# Altium footprint library STM32L476VE.PcbLib: 29 footprints (part 1 of 2)
Each footprint in its own frame and in the unit in brackets; x right, y up, seen from the top. Pads: shape width x height; smd on the part's side, far side on the other; paste and mask are expansions set on the pad; w line width, h text height; cw(c..) or ccw(c..) is an arc to the next point about the centre after c.
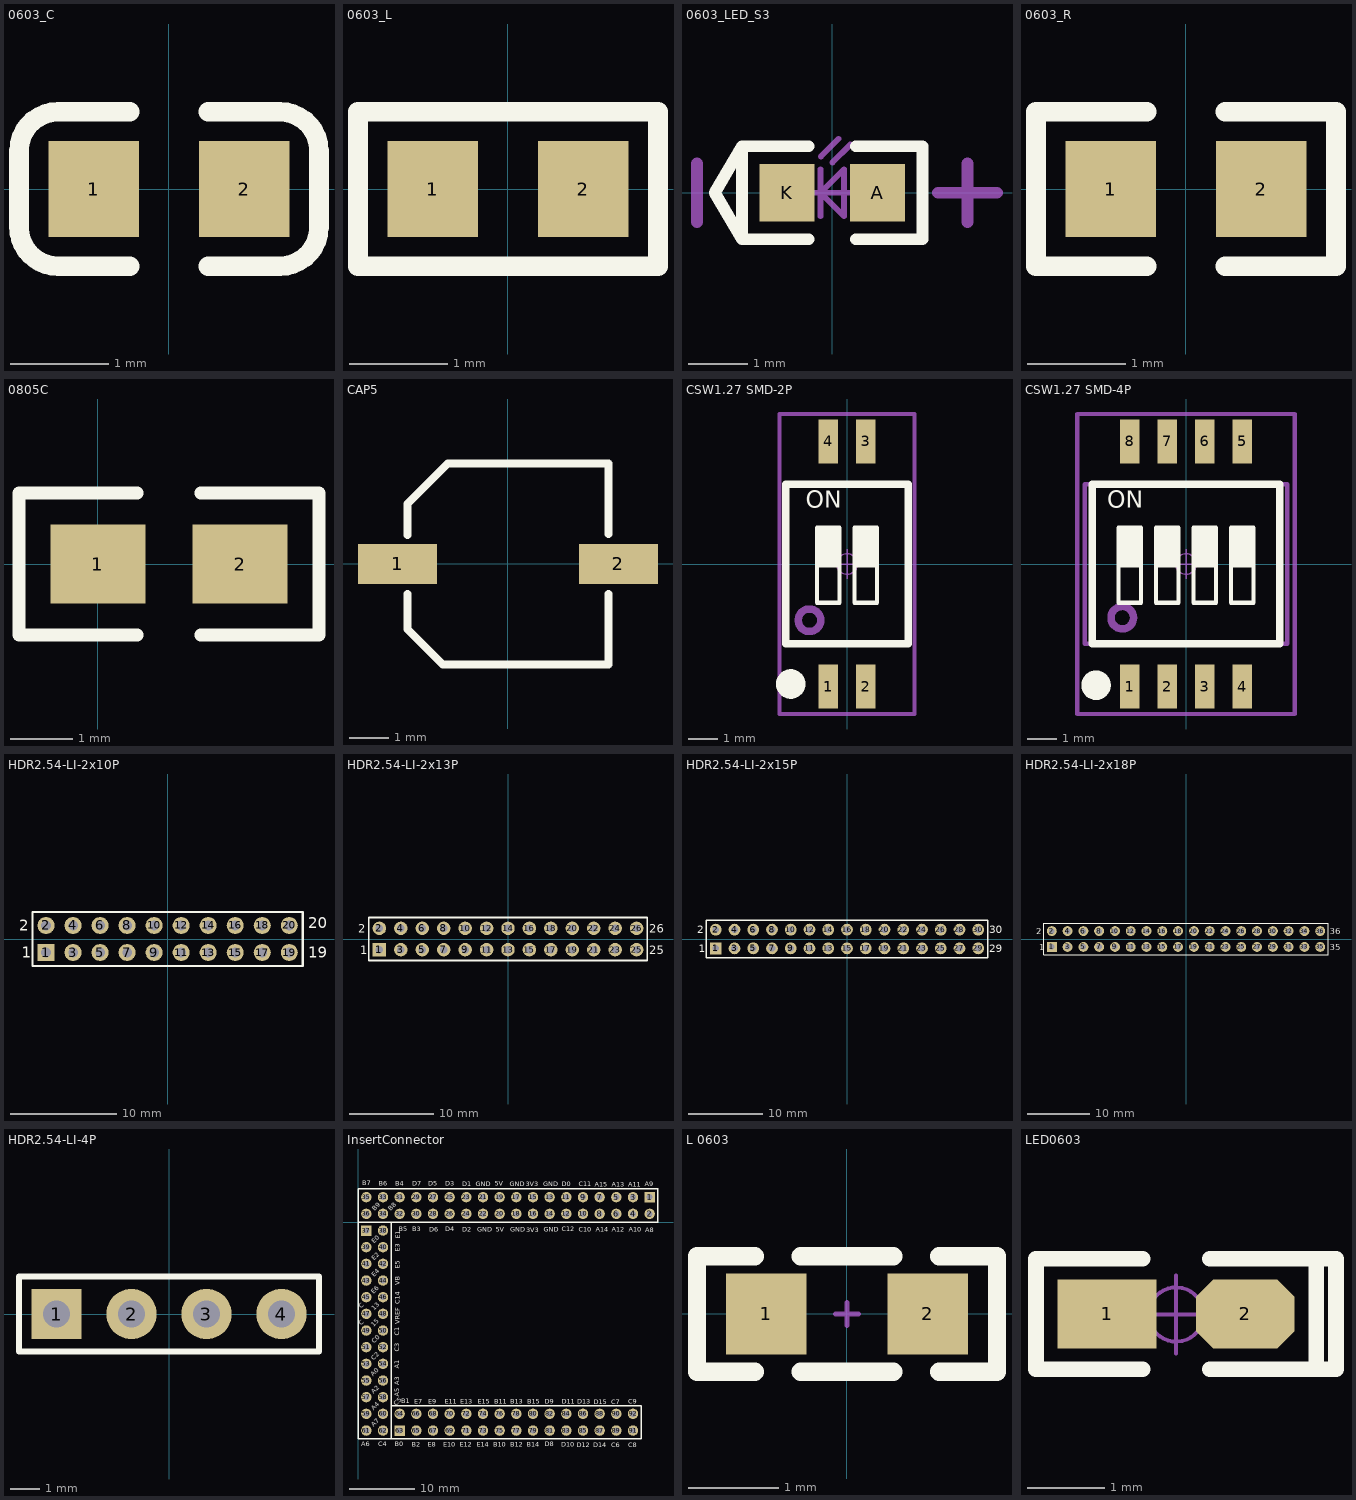
[diagram p0: the footprints below, top view; thin cyan lines are the x and y axes]

## 0603_C [mm]
pads (2):
  rect 0.93x0.98 smd: 1(-0.77,0) 2(0.77,0)
Top Overlay:
  lines w0.2: -0.4,-0.79 -1.135,-0.79 cw(c-1.135,-0.39) -1.535,-0.39 -1.535,0.39 cw(c-1.135,0.39) -1.135,0.79 -0.4,0.79 ; 0.4,-0.79 1.135,-0.79 ccw(c1.135,-0.39) 1.535,-0.39 1.535,0.39 ccw(c1.135,0.39) 1.135,0.79 0.4,0.79
3D body "User Library-0603 SMD Capacitor.STEP": height 0.3, standoff 0, extent -0.8,-0.4 0.8,0.4

## 0603_L [mm]
pads (2):
  rect 0.93x0.98 smd: 1(-0.77,0) 2(0.77,0)
Top Overlay:
  lines w0.2: -1.535,-0.79 1.535,-0.79 1.535,0.79 -1.535,0.79 -1.535,-0.79
3D body "L0603.STEP": height 0.46, standoff -0.01, extent -0.825,-0.412 0.825,0.413

## 0603_LED_S3 [mm]
pads (2):
  rect 0.93x0.98 smd: A(0.77,0) K(-0.77,0)
Top Overlay:
  lines w0.2: -0.4,-0.79 -1.535,-0.79 ; -0.4,0.79 -1.535,0.79 ; 0.4,-0.79 1.535,-0.79 1.535,0.79 0.4,0.79 ; -1.535,-0.79 -1.535,0.79 ; -1.535,-0.79 -2,0 -1.535,0.79
Mechanical 13:
  lines w0.1: -0.4,0 0.4,0 ; -0.2,-0.4 -0.2,0.4 ; -0.195,0.617 0.105,0.917 ; 0.005,0.517 0.305,0.817 ; -0.2,0 0.2,-0.4 0.2,0.4 -0.2,0
Mechanical 15:
  lines w0.203: -2.3,-0.5 -2.3,0.5 ; 1.8,0 2.8,0 ; 2.3,-0.5 2.3,0.5
3D body "User Library-LED_0603_R.STEP": height 0.6, standoff 0, extent -0.8,-0.4 0.8,0.4

## 0603_R [mm]
pads (2):
  rect 0.93x0.98 smd: 1(-0.77,0) 2(0.77,0)
Top Overlay:
  lines w0.2: -0.4,-0.79 -1.535,-0.79 -1.535,0.79 -0.4,0.79 ; 0.4,-0.79 1.535,-0.79 1.535,0.79 0.4,0.79
3D body "User Library-RES_1609-0603.STEP": height 0.56, standoff 0, extent -0.85,-0.4 0.85,0.4

## 0805C [mil] "2.0mmx1.2mm（蒜米工坊）"
height 19.68
pads (2):
  rect 60x50 smd: 1(0,0) 2(90,0)
Top Overlay:
  lines w8: 25,-45 -50,-45 -50,45 25,45 ; 65,-45 140,-45 140,45 65,45
3D body "R0805.STEP": height 21.65, standoff 0, extent 4.64,-24.8 83.37,24.81

## CAP5 [mm] "直径5mm"
pads (2):
  rect 2x1 smd: 1(-2.794,0) 2(2.794,0)
Top Overlay:
  lines w0.2: -2.54,-0.762 -2.54,-1.651 -1.651,-2.54 2.54,-2.54 2.54,-0.762 ; -2.54,0.73 -2.54,1.524 -1.524,2.54 2.54,2.54 2.54,0.762
3D body "SL-B.STEP": height 5.2, standoff 0, extent -2.274,-2.15 2.326,2.15

## CSW1.27 SMD-2P [mm] "长：4.14mm，宽：5.4mm，高：2.3mm"
pads (4):
  rect 0.65x1.5 smd: 1(-0.635,-4.15) 2(0.635,-4.15) 3(0.635,4.15) 4(-0.635,4.15)
Top Overlay:
  circle w0.5: c-1.905,-4.064 r0.25
  region: -0.254,1.225 -1.016,1.225 -1.016,-0.045 -0.254,-0.045
  region: 1.016,1.225 0.254,1.225 0.254,-0.045 1.016,-0.045
  lines w0.15: -1.016,-0.045 -0.254,-0.045 ; 0.254,-0.045 1.016,-0.045 ; -1.016,-1.315 -0.254,-1.315 -0.254,1.225 -1.016,1.225 -1.016,-1.315 ; 0.254,-1.315 1.016,-1.315 1.016,1.225 0.254,1.225 0.254,-1.315
  lines w0.254: -2.07,-2.7 -2.07,2.7 2.07,2.7 2.07,-2.7 -2.07,-2.7
  text "ON" at -1.397,1.696 h1
Mechanical 13:
  circle w0.254: c-1.27,-1.905 r0.381
  lines w0.15: -2.032,-2.7 2.032,-2.7 2.032,2.7 -2.032,2.7 -2.032,-2.7
Mechanical 15:
  circle w0.05: c0,0 r0.35
  lines w0.05: -0.5,0 0.5,0 ; 0,-0.5 0,0.5
  lines w0.15: -2.286,-5.08 2.159,-5.08 2.286,-5.08 2.286,5.08 -2.286,5.08 -2.286,-5.08
3D body "CSW1.27-SMD-2P.STEP": height 2.35, standoff 0, extent -2.07,-4.35 2.07,4.35

## CSW1.27 SMD-4P [mm] "长：6.68mm，宽：5.4mm，高：2.3mm"
pads (8):
  rect 0.65x1.5 smd: 1(-1.905,-4.15) 2(-0.635,-4.15) 3(0.635,-4.15) 4(1.905,-4.15) 5(1.905,4.15) 6(0.635,4.15) 7(-0.635,4.15) 8(-1.905,4.15)
Top Overlay:
  circle w0.5: c-3.048,-4.105 r0.25
  region: 2.286,1.225 1.524,1.225 1.524,-0.045 2.286,-0.045
  region: 1.016,1.225 0.254,1.225 0.254,-0.045 1.016,-0.045
  region: -0.254,1.225 -1.016,1.225 -1.016,-0.045 -0.254,-0.045
  region: -1.524,1.225 -2.286,1.225 -2.286,-0.045 -1.524,-0.045
  lines w0.15: -2.286,-0.045 -1.524,-0.045 ; -1.016,-0.045 -0.254,-0.045 ; 0.254,-0.045 1.016,-0.045 ; 1.524,-0.045 2.286,-0.045 ; -2.286,-1.315 -2.286,1.225 -1.524,1.225 -1.524,-1.315 -2.286,-1.315 ; -1.016,-1.315 -1.016,1.225 -0.254,1.225 -0.254,-1.315 -1.016,-1.315 ; 0.254,-1.315 0.254,1.225 1.016,1.225 1.016,-1.315 0.254,-1.315 ; 1.524,-1.315 1.524,1.225 2.286,1.225 2.286,-1.315 1.524,-1.315
  lines w0.254: -3.175,-2.7 3.175,-2.7 3.175,2.7 -3.175,2.7 -3.175,-2.7
  text "ON" at -2.667,1.696 h1
Mechanical 13:
  circle w0.254: c-2.159,-1.819 r0.381
  lines w0.15: -3.429,-2.7 -3.429,2.7 3.429,2.7 3.429,-2.7 -3.429,-2.7
Mechanical 15:
  circle w0.05: c0,0 r0.35
  lines w0.05: -0.5,0 0.5,0 ; 0,-0.5 0,0.5
  lines w0.15: -3.683,-5.08 -3.683,5.08 3.683,5.08 3.683,-5.08 2.159,-5.08 -3.683,-5.08
3D body "CSW1.27-SMD-4P.STEP": height 2.35, standoff 0, extent -3.34,-4.35 3.34,4.35

## HDR2.54-LI-2x10P [mm] "双排排针，10x2脚"
pads (20):
  rect 1.6x1.6 hole 0.9: 1(-11.43,-1.27)
  round 1.6 hole 0.9: 2(-11.43,1.27) 3(-8.89,-1.27) 4(-8.89,1.27) 5(-6.35,-1.27) 6(-6.35,1.27) 7(-3.81,-1.27) 8(-3.81,1.27) 9(-1.27,-1.27) 10(-1.27,1.27) 11(1.27,-1.27) 12(1.27,1.27) 13(3.81,-1.27) 14(3.81,1.27) 15(6.35,-1.27) 16(6.35,1.27) 17(8.89,-1.27) 18(8.89,1.27) 19(11.43,-1.27) 20(11.43,1.27)
Top Overlay:
  lines w0.2: -12.7,-2.54 -12.7,2.54 12.7,2.54 12.7,-2.54 -12.7,-2.54
  text "2" at -13.97,0.762 h1.02
  text "1" at -13.716,-1.778 h1.02
  text "20" at 13.208,1.016 h1.02
  text "19" at 13.208,-1.778 h1.02
3D body "HDR2.54-1x2P.STEP": height 8.5, standoff -3, extent -2.54,-2.54 0,2.54
3D body "HDR2.54-1x2P.STEP": height 8.5, standoff -3, extent -10.16,-2.54 -7.62,2.54
3D body "HDR2.54-1x2P.STEP": height 8.5, standoff -3, extent -12.7,-2.54 -10.16,2.54
3D body "HDR2.54-1x2P.STEP": height 8.5, standoff -3, extent -5.08,-2.54 -2.54,2.54
3D body "HDR2.54-1x2P.STEP": height 8.5, standoff -3, extent -7.62,-2.54 -5.08,2.54
3D body "HDR2.54-1x2P.STEP": height 8.5, standoff -3, extent 10.16,-2.54 12.7,2.54
3D body "HDR2.54-1x2P.STEP": height 8.5, standoff -3, extent 2.54,-2.54 5.08,2.54
3D body "HDR2.54-1x2P.STEP": height 8.5, standoff -3, extent 0,-2.54 2.54,2.54
3D body "HDR2.54-1x2P.STEP": height 8.5, standoff -3, extent 7.62,-2.54 10.16,2.54
3D body "HDR2.54-1x2P.STEP": height 8.5, standoff -3, extent 5.08,-2.54 7.62,2.54

## HDR2.54-LI-2x13P [mm] "双排排针，13x2脚"
pads (26):
  rect 1.6x1.6 hole 0.9: 1(-15.24,-1.27)
  round 1.6 hole 0.9: 2(-15.24,1.27) 3(-12.7,-1.27) 4(-12.7,1.27) 5(-10.16,-1.27) 6(-10.16,1.27) 7(-7.62,-1.27) 8(-7.62,1.27) 9(-5.08,-1.27) 10(-5.08,1.27) 11(-2.54,-1.27) 12(-2.54,1.27) 13(0,-1.27) 14(0,1.27) 15(2.54,-1.27) 16(2.54,1.27) 17(5.08,-1.27) 18(5.08,1.27) 19(7.62,-1.27) 20(7.62,1.27) 21(10.16,-1.27) 22(10.16,1.27) 23(12.7,-1.27) 24(12.7,1.27) 25(15.24,-1.27) 26(15.24,1.27)
Top Overlay:
  lines w0.2: -16.51,-2.54 -16.51,2.54 16.51,2.54 16.51,-2.54 -16.51,-2.54
  text "2" at -17.78,0.762 h1.02
  text "1" at -17.526,-1.778 h1.02
  text "25" at 16.764,-1.778 h1.02
  text "26" at 16.764,0.762 h1.02
3D body "HDR2.54-1x2P.STEP": height 8.5, standoff -3, extent -6.35,-2.54 -3.81,2.54
3D body "HDR2.54-1x2P.STEP": height 8.5, standoff -3, extent -13.97,-2.54 -11.43,2.54
3D body "HDR2.54-1x2P.STEP": height 8.5, standoff -3, extent -16.51,-2.54 -13.97,2.54
3D body "HDR2.54-1x2P.STEP": height 8.5, standoff -3, extent -8.89,-2.54 -6.35,2.54
3D body "HDR2.54-1x2P.STEP": height 8.5, standoff -3, extent -11.43,-2.54 -8.89,2.54
3D body "HDR2.54-1x2P.STEP": height 8.5, standoff -3, extent 6.35,-2.54 8.89,2.54
3D body "HDR2.54-1x2P.STEP": height 8.5, standoff -3, extent -1.27,-2.54 1.27,2.54
3D body "HDR2.54-1x2P.STEP": height 8.5, standoff -3, extent -3.81,-2.54 -1.27,2.54
3D body "HDR2.54-1x2P.STEP": height 8.5, standoff -3, extent 3.81,-2.54 6.35,2.54
3D body "HDR2.54-1x2P.STEP": height 8.5, standoff -3, extent 1.27,-2.54 3.81,2.54
3D body "HDR2.54-1x2P.STEP": height 8.5, standoff -3, extent 11.43,-2.54 13.97,2.54
3D body "HDR2.54-1x2P.STEP": height 8.5, standoff -3, extent 8.89,-2.54 11.43,2.54
3D body "HDR2.54-1x2P.STEP": height 8.5, standoff -3, extent 13.97,-2.54 16.51,2.54

## HDR2.54-LI-2x15P [mm] "双排排针，15x2脚"
pads (30):
  rect 1.6x1.6 hole 0.9: 1(-17.78,-1.27)
  round 1.6 hole 0.9: 2(-17.78,1.27) 3(-15.24,-1.27) 4(-15.24,1.27) 5(-12.7,-1.27) 6(-12.7,1.27) 7(-10.16,-1.27) 8(-10.16,1.27) 9(-7.62,-1.27) 10(-7.62,1.27) 11(-5.08,-1.27) 12(-5.08,1.27) 13(-2.54,-1.27) 14(-2.54,1.27) 15(0,-1.27) 16(0,1.27) 17(2.54,-1.27) 18(2.54,1.27) 19(5.08,-1.27) 20(5.08,1.27) 21(7.62,-1.27) 22(7.62,1.27) 23(10.16,-1.27) 24(10.16,1.27) 25(12.7,-1.27) 26(12.7,1.27) 27(15.24,-1.27) 28(15.24,1.27) 29(17.78,-1.27) 30(17.78,1.27)
Top Overlay:
  lines w0.2: -19.05,-2.54 -19.05,2.54 19.05,2.54 19.05,-2.54 -19.05,-2.54
  text "30" at 19.304,0.762 h1.02
  text "29" at 19.304,-1.778 h1.02
  text "2" at -20.32,0.762 h1.02
  text "1" at -20.066,-1.778 h1.02
3D body "HDR2.54-1x2P.STEP": height 8.5, standoff -3, extent 11.43,-2.54 13.97,2.54
3D body "HDR2.54-1x2P.STEP": height 8.5, standoff -3, extent 13.97,-2.54 16.51,2.54
3D body "HDR2.54-1x2P.STEP": height 8.5, standoff -3, extent 6.35,-2.54 8.89,2.54
3D body "HDR2.54-1x2P.STEP": height 8.5, standoff -3, extent 8.89,-2.54 11.43,2.54
3D body "HDR2.54-1x2P.STEP": height 8.5, standoff -3, extent 16.51,-2.54 19.05,2.54
3D body "HDR2.54-1x2P.STEP": height 8.5, standoff -3, extent -1.27,-2.54 1.27,2.54
3D body "HDR2.54-1x2P.STEP": height 8.5, standoff -3, extent 1.27,-2.54 3.81,2.54
3D body "HDR2.54-1x2P.STEP": height 8.5, standoff -3, extent -6.35,-2.54 -3.81,2.54
3D body "HDR2.54-1x2P.STEP": height 8.5, standoff -3, extent -3.81,-2.54 -1.27,2.54
3D body "HDR2.54-1x2P.STEP": height 8.5, standoff -3, extent 3.81,-2.54 6.35,2.54
3D body "HDR2.54-1x2P.STEP": height 8.5, standoff -3, extent -13.97,-2.54 -11.43,2.54
3D body "HDR2.54-1x2P.STEP": height 8.5, standoff -3, extent -11.43,-2.54 -8.89,2.54
3D body "HDR2.54-1x2P.STEP": height 8.5, standoff -3, extent -19.05,-2.54 -16.51,2.54
3D body "HDR2.54-1x2P.STEP": height 8.5, standoff -3, extent -16.51,-2.54 -13.97,2.54
3D body "HDR2.54-1x2P.STEP": height 8.5, standoff -3, extent -8.89,-2.54 -6.35,2.54

## HDR2.54-LI-2x18P [mm] "双排排针，18x2脚"
pads (36):
  rect 1.6x1.6 hole 0.9: 1(-21.59,-1.27)
  round 1.6 hole 0.9: 2(-21.59,1.27) 3(-19.05,-1.27) 4(-19.05,1.27) 5(-16.51,-1.27) 6(-16.51,1.27) 7(-13.97,-1.27) 8(-13.97,1.27) 9(-11.43,-1.27) 10(-11.43,1.27) 11(-8.89,-1.27) 12(-8.89,1.27) 13(-6.35,-1.27) 14(-6.35,1.27) 15(-3.81,-1.27) 16(-3.81,1.27) 17(-1.27,-1.27) 18(-1.27,1.27) 19(1.27,-1.27) 20(1.27,1.27) 21(3.81,-1.27) 22(3.81,1.27) 23(6.35,-1.27) 24(6.35,1.27) 25(8.89,-1.27) 26(8.89,1.27) 27(11.43,-1.27) 28(11.43,1.27) 29(13.97,-1.27) 30(13.97,1.27) 31(16.51,-1.27) 32(16.51,1.27) 33(19.05,-1.27) 34(19.05,1.27) 35(21.59,-1.27) 36(21.59,1.27)
Top Overlay:
  lines w0.2: -17.78,-2.54 -22.86,-2.54 ; -22.86,-2.54 22.86,-2.54 22.86,2.54 -22.86,2.54 -22.86,-2.54
  text "36" at 23.114,0.762 h1.02
  text "35" at 23.114,-1.778 h1.02
  text "1" at -23.622,-1.778 h1.02
  text "2" at -24.13,0.762 h1.02
3D body "HDR2.54-1x2P.STEP": height 8.5, standoff -3, extent -12.7,-2.54 -10.16,2.54
3D body "HDR2.54-1x2P.STEP": height 8.5, standoff -3, extent -20.32,-2.54 -17.78,2.54
3D body "HDR2.54-1x2P.STEP": height 8.5, standoff -3, extent -22.86,-2.54 -20.32,2.54
3D body "HDR2.54-1x2P.STEP": height 8.5, standoff -3, extent -15.24,-2.54 -12.7,2.54
3D body "HDR2.54-1x2P.STEP": height 8.5, standoff -3, extent -17.78,-2.54 -15.24,2.54
3D body "HDR2.54-1x2P.STEP": height 8.5, standoff -3, extent 0,-2.54 2.54,2.54
3D body "HDR2.54-1x2P.STEP": height 8.5, standoff -3, extent -7.62,-2.54 -5.08,2.54
3D body "HDR2.54-1x2P.STEP": height 8.5, standoff -3, extent -10.16,-2.54 -7.62,2.54
3D body "HDR2.54-1x2P.STEP": height 8.5, standoff -3, extent -2.54,-2.54 0,2.54
3D body "HDR2.54-1x2P.STEP": height 8.5, standoff -3, extent -5.08,-2.54 -2.54,2.54
3D body "HDR2.54-1x2P.STEP": height 8.5, standoff -3, extent 12.7,-2.54 15.24,2.54
3D body "HDR2.54-1x2P.STEP": height 8.5, standoff -3, extent 5.08,-2.54 7.62,2.54
3D body "HDR2.54-1x2P.STEP": height 8.5, standoff -3, extent 2.54,-2.54 5.08,2.54
3D body "HDR2.54-1x2P.STEP": height 8.5, standoff -3, extent 10.16,-2.54 12.7,2.54
3D body "HDR2.54-1x2P.STEP": height 8.5, standoff -3, extent 7.62,-2.54 10.16,2.54
3D body "HDR2.54-1x2P.STEP": height 8.5, standoff -3, extent 17.78,-2.54 20.32,2.54
3D body "HDR2.54-1x2P.STEP": height 8.5, standoff -3, extent 15.24,-2.54 17.78,2.54
3D body "HDR2.54-1x2P.STEP": height 8.5, standoff -3, extent 20.32,-2.54 22.86,2.54

## HDR2.54-LI-4P [mm] "排针，4脚"
pads (4):
  rect 1.7x1.7 hole 0.9: 1(-3.81,0)
  round 1.7 hole 0.9: 2(-1.27,0) 3(1.27,0) 4(3.81,0)
Top Overlay:
  lines w0.2: -5.08,-1.27 -5.08,1.27 5.08,1.27 5.08,-1.27 -5.08,-1.27
3D body "HDR2.54-1P.STEP": height 8.5, standoff -3, extent -5.08,-1.27 -2.54,1.27
3D body "HDR2.54-1P.STEP": height 8.5, standoff -3, extent -2.54,-1.27 0,1.27
3D body "HDR2.54-1P.STEP": height 8.5, standoff -3, extent 0,-1.27 2.54,1.27
3D body "HDR2.54-1P.STEP": height 8.5, standoff -3, extent 2.54,-1.27 5.08,1.27

## InsertConnector [mm] "核心板安装到其他板子上用的接口"
pads (92):
  rect 1.6x1.6 hole 0.9: 1(44.45,3.81) 37(1.27,-1.27) 63(6.35,-31.75)
  round 1.6 hole 0.9: 2(44.45,1.27) 3(41.91,3.81) 4(41.91,1.27) 5(39.37,3.81) 6(39.37,1.27) 7(36.83,3.81) 8(36.83,1.27) 9(34.29,3.81) 10(34.29,1.27) 11(31.75,3.81) 12(31.75,1.27) 13(29.21,3.81) 14(29.21,1.27) 15(26.67,3.81) 16(26.67,1.27) 17(24.13,3.81) 18(24.13,1.27) 19(21.59,3.81) 20(21.59,1.27) 21(19.05,3.81) 22(19.05,1.27) 23(16.51,3.81) 24(16.51,1.27) 25(13.97,3.81) 26(13.97,1.27) 27(11.43,3.81) 28(11.43,1.27) 29(8.89,3.81) 30(8.89,1.27) 31(6.35,3.81) 32(6.35,1.27) 33(3.81,3.81) 34(3.81,1.27) 35(1.27,3.81) 36(1.27,1.27) 38(3.81,-1.27) 39(1.27,-3.81) 40(3.81,-3.81) 41(1.27,-6.35) 42(3.81,-6.35) 43(1.27,-8.89) 44(3.81,-8.89) 45(1.27,-11.43) 46(3.81,-11.43) 47(1.27,-13.97) 48(3.81,-13.97) 49(1.27,-16.51) 50(3.81,-16.51) 51(1.27,-19.05) 52(3.81,-19.05) 53(1.27,-21.59) 54(3.81,-21.59) 55(1.27,-24.13) 56(3.81,-24.13) 57(1.27,-26.67) 58(3.81,-26.67) 59(1.27,-29.21) 60(3.81,-29.21) 61(1.27,-31.75) 62(3.81,-31.75) 64(6.35,-29.21) 65(8.89,-31.75) 66(8.89,-29.21) 67(11.43,-31.75) 68(11.43,-29.21) 69(13.97,-31.75) 70(13.97,-29.21) 71(16.51,-31.75) 72(16.51,-29.21) 73(19.05,-31.75) 74(19.05,-29.21) 75(21.59,-31.75) 76(21.59,-29.21) 77(24.13,-31.75) 78(24.13,-29.21) 79(26.67,-31.75) 80(26.67,-29.21) 81(29.21,-31.75) 82(29.21,-29.21) 83(31.75,-31.75) 84(31.75,-29.21) 85(34.29,-31.75) 86(34.29,-29.21) 87(36.83,-31.75) 88(36.83,-29.21) 89(39.37,-31.75) 90(39.37,-29.21) 91(41.91,-31.75) 92(41.91,-29.21)
Top Overlay:
  lines w0.2: 40.64,5.08 45.72,5.08 0,5.08 0,0 ; 45.66,-0.092 45.66,4.988 ; 45.72,0 0,0 ; 0,0 0,-33.02 5.08,-33.02 ; 0,0 5.08,0 5.08,-33.02 ; 5.08,-33.02 5.08,-27.94 43.18,-27.94 43.18,-33.02 5.08,-33.02
  text "A11" at 41.157,5.4 h0.7
  text "A9" at 43.701,5.44 h0.7
  text "A13" at 38.708,5.365 h0.7
  text "A15" at 36.092,5.415 h0.7
  text "C11" at 33.622,5.44 h0.7
  text "D0" at 31.04,5.46 h0.7
  text "GND" at 28.23,5.475 h0.7
  text "3V3" at 25.58,5.475 h0.7
  text "GND" at 23.095,5.5 h0.7
  text "5V" at 20.835,5.52 h0.7
  text "GND" at 17.97,5.5 h0.7
  text "D1" at 15.905,5.51 h0.7
  text "D3" at 13.27,5.545 h0.7
  text "D5" at 10.735,5.52 h0.7
  text "D7" at 8.27,5.52 h0.7
  text "B4" at 5.668,5.545 h0.7
  text "B6" at 3.145,5.565 h0.7
  text "B7" at 0.635,5.6 h0.7
  text "B9" at 2.54,1.651 h0.7
  text "B8" at 5.01,1.681 h0.7
  text "B3" at 8.255,-1.397 h0.7
  text "D6" at 10.823,-1.422 h0.7
  text "D4" at 13.295,-1.422 h0.7
  text "D2" at 15.893,-1.437 h0.7
  text "GND" at 18.153,-1.456 h0.7
  text "5V" at 20.978,-1.467 h0.7
  text "GND" at 23.178,-1.472 h0.7
  text "3V3" at 25.678,-1.517 h0.7
  text "GND" at 28.278,-1.447 h0.7
  text "A8" at 43.804,-1.517 h0.7
  text "A10" at 41.26,-1.497 h0.7
  text "A12" at 38.69,-1.497 h0.7
  text "A14" at 36.195,-1.497 h0.7
  text "C10" at 33.648,-1.437 h0.7
  text "C12" at 31.085,-1.412 h0.7
  text "B5" at 6.223,-1.397 h0.7
  text "A3" at 6.292,-24.876 h0.7
  text "A1" at 6.272,-22.371 h0.7
  text "C3" at 6.317,-19.782 h0.7
  text "C1" at 6.303,-17.298 h0.7
  text "VREF" at 6.362,-15.542 h0.7
  text "C14" at 6.332,-12.497 h0.7
  text "VB" at 6.327,-9.637 h0.7
  text "E5" at 6.332,-7.102 h0.7
  text "E3" at 6.332,-4.506 h0.7
  text "C5" at 5.842,-28.067 h0.7
  text "A5" at 6.252,-26.631 h0.7
  text "E1" at 6.422,-2.505 h0.7
  text "C7" at 38.604,-27.726 h0.7
  text "C9" at 41.148,-27.686 h0.7
  text "D15" at 35.897,-27.746 h0.7
  text "D13" at 33.432,-27.696 h0.7
  text "D11" at 31.069,-27.686 h0.7
  text "D9" at 28.487,-27.666 h0.7
  text "B15" at 25.757,-27.696 h0.7
  text "B13" at 23.217,-27.676 h0.7
  text "B11" at 20.785,-27.666 h0.7
  text "E15" at 18.281,-27.666 h0.7
  text "E13" at 15.597,-27.666 h0.7
  text "E11" at 13.192,-27.641 h0.7
  text "E9" at 10.669,-27.666 h0.7
  text "E7" at 8.607,-27.656 h0.7
  text "B1" at 6.607,-27.621 h0.7
  text "D8" at 28.429,-34.185 h0.7
  text "D10" at 30.992,-34.21 h0.7
  text "D12" at 33.322,-34.28 h0.7
  text "D14" at 35.867,-34.28 h0.7
  text "C6" at 38.604,-34.27 h0.7
  text "C8" at 41.148,-34.29 h0.7
  text "B14" at 25.687,-34.225 h0.7
  text "B12" at 23.177,-34.19 h0.7
  text "B10" at 20.632,-34.205 h0.7
  text "E14" at 18.062,-34.215 h0.7
  text "E12" at 15.527,-34.195 h0.7
  text "E10" at 12.992,-34.225 h0.7
  text "E8" at 10.639,-34.195 h0.7
  text "B2" at 8.169,-34.22 h0.7
  text "B0" at 5.599,-34.17 h0.7
  text "C4" at 3.069,-34.185 h0.7
  text "A6" at 0.469,-34.185 h0.7
  text "A4" at 2.433,-28.737 h0.7
  text "A7" at 2.413,-31.242 h0.7
  text "A2" at 2.403,-26.212 h0.7
  text "A0" at 2.338,-23.592 h0.7
  text "C2" at 2.408,-21.142 h0.7
  text "C0" at 2.478,-18.532 h0.7
  text "15" at 2.433,-16.037 h0.7
  text "13" at 2.448,-13.482 h0.7
  text "E6" at 2.413,-10.977 h0.7
  text "E4" at 2.488,-8.392 h0.7
  text "E2" at 2.468,-5.842 h0.7
  text "E0" at 2.453,-3.281 h0.7
  text "C" at 0.508,-13.208 h0.7
  text "C" at 0.508,-15.748 h0.7
3D body "HDR2.54-1x2P.STEP": height 8.5, standoff -3, extent 35.56,-33.02 38.1,-27.94
3D body "HDR2.54-1x2P.STEP": height 8.5, standoff -3, extent 38.1,-33.02 40.64,-27.94
3D body "HDR2.54-1x2P.STEP": height 8.5, standoff -3, extent 30.48,-33.02 33.02,-27.94
3D body "HDR2.54-1x2P.STEP": height 8.5, standoff -3, extent 33.02,-33.02 35.56,-27.94
3D body "HDR2.54-1x2P.STEP": height 8.5, standoff -3, extent 40.64,-33.02 43.18,-27.94
3D body "HDR2.54-1x2P.STEP": height 8.5, standoff -3, extent 22.86,-33.02 25.4,-27.94
3D body "HDR2.54-1x2P.STEP": height 8.5, standoff -3, extent 25.4,-33.02 27.94,-27.94
3D body "HDR2.54-1x2P.STEP": height 8.5, standoff -3, extent 17.78,-33.02 20.32,-27.94
3D body "HDR2.54-1x2P.STEP": height 8.5, standoff -3, extent 20.32,-33.02 22.86,-27.94
3D body "HDR2.54-1x2P.STEP": height 8.5, standoff -3, extent 27.94,-33.02 30.48,-27.94
3D body "HDR2.54-1x2P.STEP": height 8.5, standoff -3, extent 10.16,-33.02 12.7,-27.94
3D body "HDR2.54-1x2P.STEP": height 8.5, standoff -3, extent 12.7,-33.02 15.24,-27.94
3D body "HDR2.54-1x2P.STEP": height 8.5, standoff -3, extent 5.08,-33.02 7.62,-27.94
3D body "HDR2.54-1x2P.STEP": height 8.5, standoff -3, extent 7.62,-33.02 10.16,-27.94
3D body "HDR2.54-1x2P.STEP": height 8.5, standoff -3, extent 15.24,-33.02 17.78,-27.94
3D body "HDR2.54-1x2P.STEP": height 8.5, standoff -3, extent 33.02,0 35.56,5.08
3D body "HDR2.54-1x2P.STEP": height 8.5, standoff -3, extent 40.64,0 43.18,5.08
3D body "HDR2.54-1x2P.STEP": height 8.5, standoff -3, extent 43.18,0 45.72,5.08
3D body "HDR2.54-1x2P.STEP": height 8.5, standoff -3, extent 35.56,0 38.1,5.08
3D body "HDR2.54-1x2P.STEP": height 8.5, standoff -3, extent 38.1,0 40.64,5.08
3D body "HDR2.54-1x2P.STEP": height 8.5, standoff -3, extent 20.32,0 22.86,5.08
3D body "HDR2.54-1x2P.STEP": height 8.5, standoff -3, extent 27.94,0 30.48,5.08
3D body "HDR2.54-1x2P.STEP": height 8.5, standoff -3, extent 30.48,0 33.02,5.08
3D body "HDR2.54-1x2P.STEP": height 8.5, standoff -3, extent 22.86,0 25.4,5.08
3D body "HDR2.54-1x2P.STEP": height 8.5, standoff -3, extent 25.4,0 27.94,5.08
3D body "HDR2.54-1x2P.STEP": height 8.5, standoff -3, extent 7.62,0 10.16,5.08
3D body "HDR2.54-1x2P.STEP": height 8.5, standoff -3, extent 15.24,0 17.78,5.08
3D body "HDR2.54-1x2P.STEP": height 8.5, standoff -3, extent 17.78,0 20.32,5.08
3D body "HDR2.54-1x2P.STEP": height 8.5, standoff -3, extent 10.16,0 12.7,5.08
3D body "HDR2.54-1x2P.STEP": height 8.5, standoff -3, extent 12.7,0 15.24,5.08
3D body "HDR2.54-1x2P.STEP": height 8.5, standoff -3, extent 2.54,0 5.08,5.08
3D body "HDR2.54-1x2P.STEP": height 8.5, standoff -3, extent 5.08,0 7.62,5.08
3D body "HDR2.54-1x2P.STEP": height 8.5, standoff -3, extent 0,0 2.54,5.08
3D body "HDR2.54-1x2P.STEP": height 8.5, standoff -3, extent 0,-33.02 5.08,-30.48
3D body "HDR2.54-1x2P.STEP": height 8.5, standoff -3, extent 0,-27.94 5.08,-25.4
3D body "HDR2.54-1x2P.STEP": height 8.5, standoff -3, extent 0,-30.48 5.08,-27.94
3D body "HDR2.54-1x2P.STEP": height 8.5, standoff -3, extent 0,-20.32 5.08,-17.78
3D body "HDR2.54-1x2P.STEP": height 8.5, standoff -3, extent 0,-22.86 5.08,-20.32
3D body "HDR2.54-1x2P.STEP": height 8.5, standoff -3, extent 0,-15.24 5.08,-12.7
3D body "HDR2.54-1x2P.STEP": height 8.5, standoff -3, extent 0,-17.78 5.08,-15.24
3D body "HDR2.54-1x2P.STEP": height 8.5, standoff -3, extent 0,-25.4 5.08,-22.86
3D body "HDR2.54-1x2P.STEP": height 8.5, standoff -3, extent 0,-7.62 5.08,-5.08
3D body "HDR2.54-1x2P.STEP": height 8.5, standoff -3, extent 0,-10.16 5.08,-7.62
3D body "HDR2.54-1x2P.STEP": height 8.5, standoff -3, extent 0,-2.54 5.08,0
3D body "HDR2.54-1x2P.STEP": height 8.5, standoff -3, extent 0,-5.08 5.08,-2.54
3D body "HDR2.54-1x2P.STEP": height 8.5, standoff -3, extent 0,-12.7 5.08,-10.16

## L 0603 [mil] "小功率贴片电感"
pads (2):
  rect 35x35 smd: 1(-35,0) 2(35,0)
Top Overlay:
  lines w8: -40,-25 -65,-25 -65,25 -40,25 ; -20,-25 20,-25 ; -20,25 20,25 ; 40,-25 65,-25 65,25 40,25
Mechanical 15:
  lines w2: -5,0 5,0 ; 0,-5 0,0 0,5
3D body "0603.STEP": height 31.5, standoff -0.11, extent -31.5,-15.75 31.5,15.75

## LED0603 [mil] "LED 0603"
pads (2):
  rect 50x35 smd: 1(-513.97,-318.44)
  oct 50x35 smd: 2(-443.97,-318.44)
Top Overlay:
  lines w8: -495.97,-346.44 -549.97,-346.44 -549.97,-344.44 -549.97,-290.44 -548.97,-290.44 -495.97,-290.44 ; -461.97,-346.44 -408.97,-346.44 ; -461.97,-290.44 -407.97,-290.44 -397.97,-290.44 -397.97,-346.44 -407.97,-346.44 -407.97,-292.44
Mechanical 15:
  circle w1.97: c-478.98,-318.7 r13.78
  lines w1.97: -498.66,-318.7 -459.29,-318.7 ; -478.98,-338.39 -478.98,-299.02
3D body "LED 0603-B.STEP": height 18.36, standoff -0.16, extent -510.47,-334.49 -447.48,-302.91
3D body "LED 0603玻璃罩.ST": height 23.82, standoff 8.07, extent -502.56,-334.49 -455.39,-302.91